# Altium footprint library pcb2D3D库101.PcbLib: 411 footprints (part 22 of 26)
Each footprint in its own frame and in the unit in brackets; x right, y up, seen from the top. Pads: shape width x height; smd on the part's side, far side on the other; paste and mask are expansions set on the pad; w line width, h text height; cw(c..) or ccw(c..) is an arc to the next point about the centre after c.
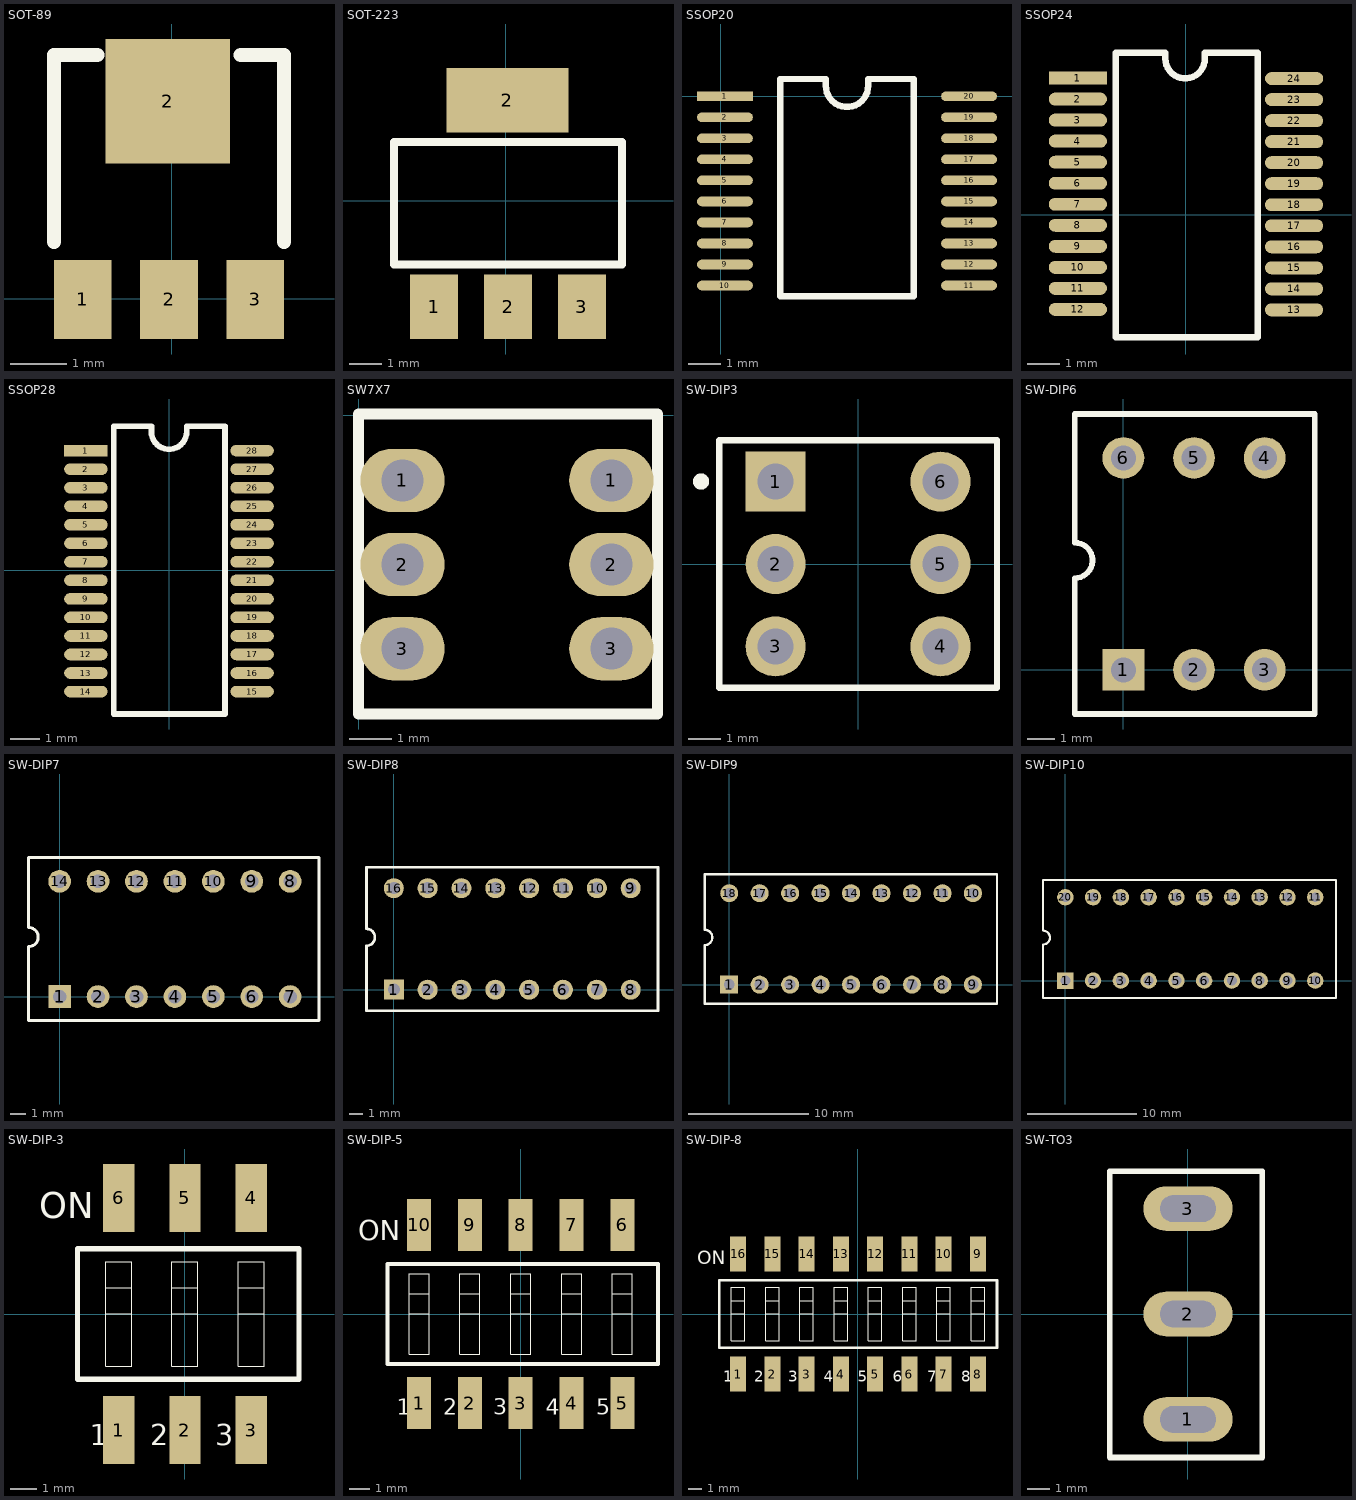
[diagram p21: the footprints below, top view; thin cyan lines are the x and y axes]

## SOT-89 [mil]
pads (4):
  rect 40x55 smd: 1(-61.82,-0.57) 2(-1.82,-0.57) 3(58.18,-0.57)
  rect 86.61x86.61 smd: 2(-2.76,137.22)
TopOverlay:
  lines w10: -81.82,39.43 -81.82,169.43 -51.82,169.43 ; 48.18,169.43 78.18,169.43 78.18,39.43
3D body "SOT-89.STEP": height 59.45, standoff 0, extent -90.07,-6.45 87.1,162.85

## SOT-223 [mil]
pads (4):
  rect 59x79 smd: 1(-88,-130) 2(2.55,-130) 3(93.1,-130)
  rect 150x79 smd: 2(1.88,123.54)
TopOverlay:
  lines w10: -137.45,-78 142.55,-78 142.55,72 -137.45,72 -137.45,-78
3D body "SOT-223_MP04A.STEP": height 66.93, standoff 0, extent -126.41,-138.72 129.5,135.3

## SSOP20 [mm]
pads (20):
  rect 1.727x0.3 smd: 1(0.127,0)
  oval 1.727x0.3 smd: 2(0.127,-0.65) 3(0.127,-1.3) 4(0.127,-1.95) 5(0.127,-2.6) 6(0.127,-3.25) 7(0.127,-3.9) 8(0.127,-4.55) 9(0.127,-5.2) 10(0.127,-5.85) 11(7.673,-5.85) 12(7.673,-5.2) 13(7.673,-4.55) 14(7.673,-3.9) 15(7.673,-3.25) 16(7.673,-2.6) 17(7.673,-1.95) 18(7.673,-1.3) 19(7.673,-0.65) 20(7.673,0)
TopOverlay:
  lines w0.2: 1.835,-6.175 5.965,-6.175 5.965,0.533 4.555,0.533 4.555,0.325 cw(c3.9,0.325) 3.245,0.325 3.245,0.533 1.835,0.533 1.835,-6.175
3D body "SSOP-20.STEP": height 1.79, standoff -0.05, extent -0.013,-6.52 7.887,0.78

## SSOP24 [mm]
pads (24):
  rect 1.8x0.4 smd: 1(-3.326,4.229)
  oval 1.8x0.4 smd: 2(-3.326,3.579) 3(-3.326,2.93) 4(-3.326,2.28) 5(-3.326,1.63) 6(-3.326,0.981) 7(-3.326,0.331) 8(-3.326,-0.319) 9(-3.326,-0.968) 10(-3.326,-1.618) 11(-3.326,-2.267) 12(-3.326,-2.917) 13(3.353,-2.932) 14(3.353,-2.282) 15(3.353,-1.632) 16(3.353,-0.983) 17(3.353,-0.333) 18(3.353,0.316) 19(3.353,0.966) 20(3.353,1.616) 21(3.353,2.265) 22(3.353,2.915) 23(3.353,3.565) 24(3.354,4.214)
TopOverlay:
  lines w0.2: -2.159,-3.785 2.235,-3.785 2.235,5.01 0.597,5.01 0.597,4.827 cw(c-0.013,4.827) -0.622,4.827 -0.622,5.01 -2.159,5.01 -2.159,-3.785
3D body "SSOP 24 PIN_.step": height 1.78, standoff -0.21, extent -3.924,-3.654 3.976,4.976

## SSOP28 [mm]
pads (28):
  rect 1.5x0.4 smd: 1(-2.869,4.127)
  oval 1.5x0.4 smd: 2(-2.869,3.488) 3(-2.869,2.848) 4(-2.869,2.208) 5(-2.869,1.568) 6(-2.869,0.928) 7(-2.869,0.288) 8(-2.869,-0.352) 9(-2.869,-0.992) 10(-2.869,-1.631) 11(-2.869,-2.271) 12(-2.869,-2.911) 13(-2.869,-3.551) 14(-2.87,-4.191) 15(2.869,-4.191) 16(2.869,-3.551) 17(2.869,-2.911) 18(2.869,-2.271) 19(2.869,-1.631) 20(2.869,-0.992) 21(2.869,-0.352) 22(2.869,0.288) 23(2.869,0.928) 24(2.869,1.568) 25(2.869,2.208) 26(2.869,2.848) 27(2.869,3.488) 28(2.869,4.127)
TopOverlay:
  lines w0.2: -1.905,-4.966 1.93,-4.966 1.93,4.966 0.609,4.966 0.609,4.783 cw(c0,4.783) -0.609,4.783 -0.609,4.966 -1.905,4.966 -1.905,-4.966
3D body "TSSOP28.STEP": height 1.05, standoff 0, extent -3.273,-4.889 3.327,4.91

## SW7X7 [mm]
pads (6):
  oval 2x1.5 hole 1: 1(1.041,-1.549) 1(5.994,-1.549) 2(1.041,-3.543) 2(5.994,-3.543) 3(1.041,-5.537) 3(5.994,-5.537)
TopOverlay:
  lines w0.254: 0,-7.087 0,0.025 7.087,0.025 7.087,-7.087 0,-7.087
3D body "button with fixation.step": height 13, standoff -4, extent -0.02,-7.087 6.98,-0.087

## SW-DIP3 [mm] "Switch; 6 Leads"
pads (6):
  rect 1.85x1.85 hole 1.1: 1(-2.54,2.54)
  round 1.85 hole 1.1: 2(-2.54,0) 3(-2.54,-2.54) 4(2.54,-2.54) 5(2.54,0) 6(2.54,2.54)
TopOverlay:
  circle w0.25: c-4.836,2.541 r0.125
  lines w0.2: -4.28,-3.81 4.28,-3.81 4.28,3.81 -4.28,3.81 -4.28,-3.81
3D body "SW3dPS-DIP-Schalter SMD 3polig RM2,54.STEP": height 3.55, standoff -0.65, extent -3.81,-3.683 3.81,3.937

## SW-DIP6 [mm] "DIP; 16 Leads; Row Spacing 7.62 mm; Pitch 2.54 mm"
pads (6):
  rect 1.5x1.5 hole 0.9: 1(0,0)
  round 1.5 hole 0.9: 2(2.54,0) 3(5.08,0) 4(5.08,7.62) 5(2.54,7.62) 6(0,7.62)
TopOverlay:
  lines w0.2: -1.745,4.57 cw(c-1.745,3.935) -1.745,3.3 -1.745,-1.59 6.883,-1.59 6.883,9.2 -1.745,9.2 -1.745,4.6
3D body "SWITCH DIP-3.STEP": height 7, standoff -3.7, extent -1.753,-1.165 6.867,8.735

## SW-DIP7 [mm] "DIP; 16 Leads; Row Spacing 7.62 mm; Pitch 2.54 mm"
pads (14):
  rect 1.5x1.5 hole 0.9: 1(0,0)
  round 1.5 hole 0.9: 2(2.54,0) 3(5.08,0) 4(7.62,0) 5(10.16,0) 6(12.7,0) 7(15.24,0) 8(15.24,7.62) 9(12.7,7.62) 10(10.16,7.62) 11(7.62,7.62) 12(5.08,7.62) 13(2.54,7.62) 14(0,7.62)
TopOverlay:
  lines w0.2: -2.05,4.57 cw(c-2.05,3.935) -2.05,3.3 -2.05,-1.59 17.145,-1.59 17.145,9.2 -2.05,9.2 -2.05,4.6
3D body "DIPSWITCH7.STEP": height 6.9, standoff -3.2, extent -2.05,-1.245 17.09,8.915

## SW-DIP8 [mm] "DIP; 16 Leads; Row Spacing 7.62 mm; Pitch 2.54 mm"
pads (16):
  rect 1.5x1.5 hole 0.9: 1(0,0)
  round 1.5 hole 0.9: 2(2.54,0) 3(5.08,0) 4(7.62,0) 5(10.16,0) 6(12.7,0) 7(15.24,0) 8(17.78,0) 9(17.78,7.62) 10(15.24,7.62) 11(12.7,7.62) 12(10.16,7.62) 13(7.62,7.62) 14(5.08,7.62) 15(2.54,7.62) 16(0,7.62)
TopOverlay:
  lines w0.2: -2.05,4.57 cw(c-2.05,3.935) -2.05,3.3 -2.05,-1.59 19.83,-1.59 19.83,9.2 -2.05,9.2 -2.05,4.6
3D body "SW3dPS-DIP SWITCH 8 POS CTS 206.STEP": height 8.25, standoff -3.5, extent -2.286,-1.08 20.214,8.7

## SW-DIP9 [mm] "DIP; 16 Leads; Row Spacing 7.62 mm; Pitch 2.54 mm"
pads (18):
  rect 1.5x1.5 hole 0.9: 1(0,0)
  round 1.5 hole 0.9: 2(2.54,0) 3(5.08,0) 4(7.62,0) 5(10.16,0) 6(12.7,0) 7(15.24,0) 8(17.78,0) 9(20.32,0) 10(20.32,7.62) 11(17.78,7.62) 12(15.24,7.62) 13(12.7,7.62) 14(10.16,7.62) 15(7.62,7.62) 16(5.08,7.62) 17(2.54,7.62) 18(0,7.62)
TopOverlay:
  lines w0.2: -2.05,4.57 cw(c-2.05,3.935) -2.05,3.3 -2.05,-1.59 22.327,-1.59 22.327,9.2 -2.05,9.2 -2.05,4.6
3D body "DIPSWITCH9.STEP": height 6.9, standoff -3.2, extent -2.046,-1.245 22.174,8.915

## SW-DIP10 [mm] "DIP; 16 Leads; Row Spacing 7.62 mm; Pitch 2.54 mm"
pads (20):
  rect 1.5x1.5 hole 0.9: 1(0,0)
  round 1.5 hole 0.9: 2(2.54,0) 3(5.08,0) 4(7.62,0) 5(10.16,0) 6(12.7,0) 7(15.24,0) 8(17.78,0) 9(20.32,0) 10(22.86,0) 11(22.86,7.62) 12(20.32,7.62) 13(17.78,7.62) 14(15.24,7.62) 15(12.7,7.62) 16(10.16,7.62) 17(7.62,7.62) 18(5.08,7.62) 19(2.54,7.62) 20(0,7.62)
TopOverlay:
  lines w0.2: -2.05,4.57 cw(c-2.05,3.935) -2.05,3.3 -2.05,-1.59 24.765,-1.59 24.765,9.2 -2.05,9.2 -2.05,4.6
3D body "DIPSWITCH10.STEP": height 6.9, standoff -3.2, extent -2.007,-1.295 24.753,8.865

## SW-DIP-3 [mm] "DIP Switch; 16 Leads"
height 5.06
pads (6):
  rect 1.2x2.6 smd: 1(-2.54,-4.45) 2(0,-4.45) 3(2.54,-4.45) 4(2.54,4.45) 5(0,4.45) 6(-2.54,4.45)
TopOverlay:
  lines w0.025: -3.04,0 -2.04,0 ; -3.04,1 -2.04,1 ; -0.5,0 0.5,0 ; -0.5,1 0.5,1 ; 2.04,0 3.04,0 ; 2.04,1 3.04,1 ; -3.04,-2 -3.04,2 -2.04,2 -2.04,-2 -3.04,-2 ; -0.5,-2 -0.5,2 0.5,2 0.5,-2 -0.5,-2 ; 2.04,-2 2.04,2 3.04,2 3.04,-2 2.04,-2
  lines w0.2: -4.115,-2.5 -4.115,2.5 4.369,2.5 4.369,-2.5 -4.115,-2.5
  text "3" at 1.169,-5.032 h0.8
  text "2" at -1.331,-5.032 h0.8
  text "1" at -3.656,-5.032 h0.8
  text "ON" at -5.588,3.678 h1
3D body "DIP3.stp": height 4.4, standoff 0, extent -4.293,-4.951 4.267,4.849

## SW-DIP-5 [mm] "DIP Switch; 16 Leads"
height 5.06
pads (10):
  rect 1.2x2.6 smd: 1(-5.08,-4.45) 2(-2.54,-4.45) 3(0,-4.45) 4(2.54,-4.45) 5(5.08,-4.45) 6(5.08,4.45) 7(2.54,4.45) 8(0,4.45) 9(-2.54,4.45) 10(-5.08,4.45)
TopOverlay:
  lines w0.025: -5.58,0 -4.58,0 ; -5.58,1 -4.58,1 ; -3.04,0 -2.04,0 ; -3.04,1 -2.04,1 ; -0.5,0 0.5,0 ; -0.5,1 0.5,1 ; 2.04,0 3.04,0 ; 2.04,1 3.04,1 ; 4.58,0 5.58,0 ; 4.58,1 5.58,1 ; -5.58,-2 -4.58,-2 -4.58,2 -5.58,2 -5.58,-2 ; -3.04,-2 -2.04,-2 -2.04,2 -3.04,2 -3.04,-2 ; -0.5,-2 0.5,-2 0.5,2 -0.5,2 -0.5,-2 ; 2.04,-2 3.04,-2 3.04,2 2.04,2 2.04,-2 ; 4.58,-2 5.58,-2 5.58,2 4.58,2 4.58,-2
  lines w0.2: -6.655,-2.5 6.858,-2.5 6.858,2.5 -6.655,2.5 -6.655,-2.5
  text "ON" at -8.128,3.678 h1
  text "1" at -6.196,-5.032 h0.8
  text "2" at -3.871,-5.032 h0.8
  text "3" at -1.371,-5.032 h0.8
  text "4" at 1.254,-5.032 h0.8
  text "5" at 3.779,-5.032 h0.8
3D body "DIP5.stp": height 4.4, standoff 0, extent -6.795,-5.105 6.845,4.695

## SW-DIP-8 [mm] "DIP Switch; 16 Leads"
height 5.06
pads (16):
  rect 1.2x2.6 smd: 1(-8.89,-4.45) 2(-6.35,-4.45) 3(-3.81,-4.45) 4(-1.27,-4.45) 5(1.27,-4.45) 6(3.81,-4.45) 7(6.35,-4.45) 8(8.89,-4.45) 9(8.89,4.45) 10(6.35,4.45) 11(3.81,4.45) 12(1.27,4.45) 13(-1.27,4.45) 14(-3.81,4.45) 15(-6.35,4.45) 16(-8.89,4.45)
TopOverlay:
  lines w0.025: -9.39,0 -8.39,0 ; -9.39,1 -8.39,1 ; -6.85,0 -5.85,0 ; -6.85,1 -5.85,1 ; -4.31,0 -3.31,0 ; -4.31,1 -3.31,1 ; -1.77,0 -0.77,0 ; -1.77,1 -0.77,1 ; 0.77,0 1.77,0 ; 0.77,1 1.77,1 ; 3.31,0 4.31,0 ; 3.31,1 4.31,1 ; 5.85,0 6.85,0 ; 5.85,1 6.85,1 ; 8.39,0 9.39,0 ; 8.39,1 9.39,1 ; -9.39,-2 -9.39,2 -8.39,2 -8.39,-2 -9.39,-2 ; -6.85,-2 -6.85,2 -5.85,2 -5.85,-2 -6.85,-2 ; -4.31,-2 -4.31,2 -3.31,2 -3.31,-2 -4.31,-2 ; -1.77,-2 -1.77,2 -0.77,2 -0.77,-2 -1.77,-2 ; 0.77,-2 0.77,2 1.77,2 1.77,-2 0.77,-2 ; 3.31,-2 3.31,2 4.31,2 4.31,-2 3.31,-2 ; 5.85,-2 5.85,2 6.85,2 6.85,-2 5.85,-2 ; 8.39,-2 8.39,2 9.39,2 9.39,-2 8.39,-2
  lines w0.2: -10.29,-2.5 -10.29,2.5 10.31,2.5 10.31,-2.5 -10.29,-2.5
  text "6" at 2.569,-5.032 h0.8
  text "5" at -0.031,-5.032 h0.8
  text "4" at -2.556,-5.032 h0.8
  text "3" at -5.181,-5.032 h0.8
  text "2" at -7.681,-5.032 h0.8
  text "1" at -10.006,-5.032 h0.8
  text "ON" at -11.938,3.678 h1
  text "7" at 5.119,-5.032 h0.8
  text "8" at 7.659,-5.032 h0.8
3D body "SW3dPS-219-8MST.STEP": height 4.3, standoff 0.05, extent -10.182,-4.83 10.182,5.08

## SW-TO3 [mm]
height 2.38
pads (3):
  oval 4x2 hole 1.2 slot 2.5 at 0 deg: 1(0,-4.724) 2(0,0) 3(0,4.724)
TopOverlay:
  lines w0.254: -3.504,-6.433 -3.504,6.394 3.329,6.394 3.329,-6.433 -3.504,-6.433
3D body "7101SYZBE CK switch.step": height 28.55, standoff -3.83, extent -3.43,-6.363 3.43,6.35